# Altium footprint library ThroHoleCap.PcbLib: 81 footprints (part 3 of 6)
Each footprint in its own frame and in the unit in brackets; x right, y up, seen from the top. Pads: shape width x height; smd on the part's side, far side on the other; paste and mask are expansions set on the pad; w line width, h text height; cw(c..) or ccw(c..) is an arc to the next point about the centre after c.
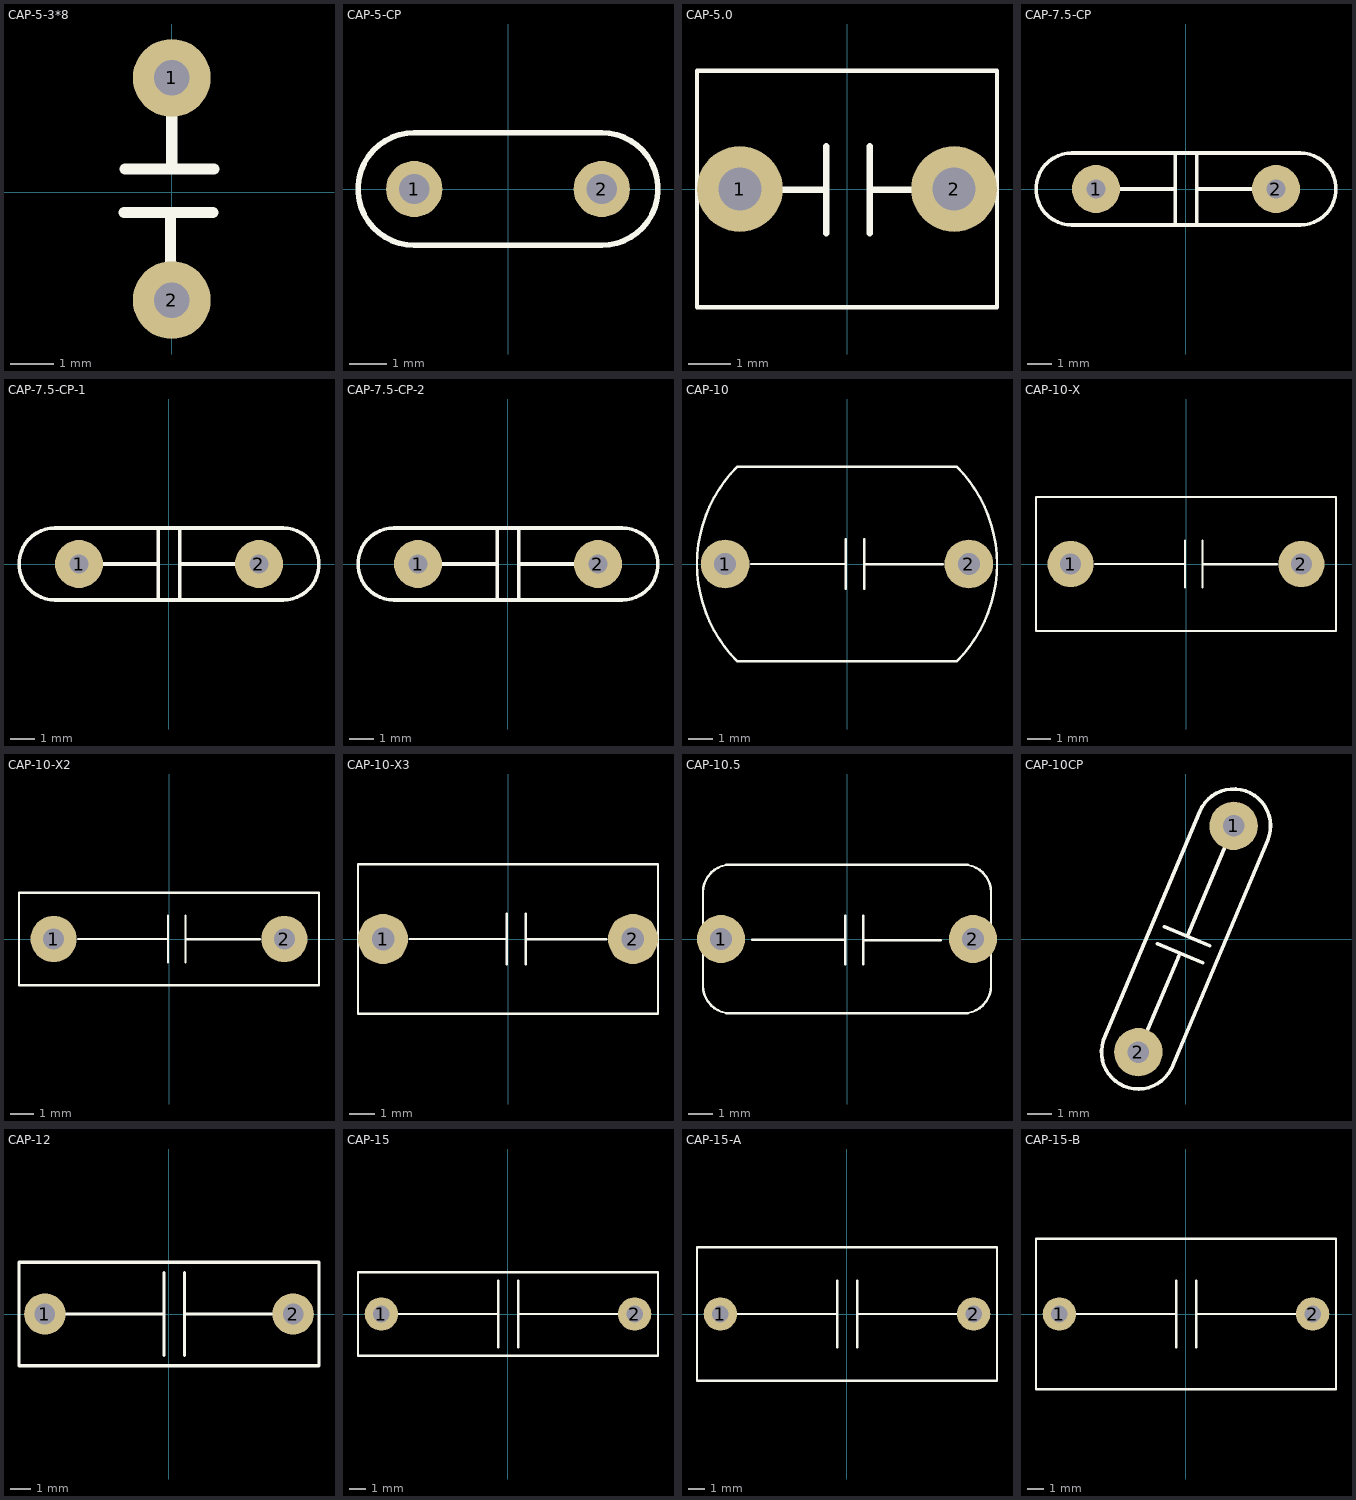
[diagram p2: the footprints below, top view; thin cyan lines are the x and y axes]

## CAP-5-3*8 [mil]
pads (2):
  round 70 hole 32: 1(0,103) 2(0,-97)
Top Overlay:
  lines w10: -43,-18 37,-18 ; -42,21 38,21 ; -1,-96 -1,-18 ; 0,21 0,103
3D body "User Library-Capacitor no pol 0_2in pitch.STEP": height 285, standoff -93.74, extent -60,-104 65,116

## CAP-5-CP [mm]
pads (2):
  round 1.5 hole 0.8: 1(-2.5,0) 2(2.5,0)
Top Overlay:
  lines w0.15: -2.5,-1.5 cw(c-2.5,0) -2.5,1.5 2.5,1.5 cw(c2.5,0) 2.5,-1.5 -2.5,-1.5
3D body "User Library-Kondensator_5mm.step": height 10.5, standoff -2.07, extent -4,-1.255 4,1.255

## CAP-5.0 [mm]
pads (2):
  round 2 hole 1: 1(-2.5,0) 2(2.5,0)
Top Overlay:
  lines w0.1: 3.5,-2.76 -3.5,-2.76 -3.5,2.76 3.5,2.76 ; 3.5,-2.75 3.5,2.75
  lines w0.15: -1.5,-0.021 -0.484,-0.021 ; -0.484,-1.037 -0.484,0.995 ; 0.532,-1.037 0.532,0.995 ; 0.532,-0.021 1.548,-0.021
3D body "User Library-CAPACITOR_5mm.step": height 11, standoff -4, extent -3.5,-2.76 3.5,2.76

## CAP-7.5-CP [mm]
pads (2):
  round 2 hole 0.8: 1(-3.75,0) 2(3.75,0)
Top Overlay:
  lines w0.15: -3.75,0 -0.45,0 ; -0.45,-1.5 -0.45,1.5 ; 0.45,-1.5 0.45,1.5 ; 0.45,0 3.75,0 ; -4.75,-1.5 cw(c-4.75,0) -4.75,1.5 4.75,1.5 cw(c4.75,0) 4.75,-1.5 -4.75,-1.5
3D body "User Library-final MOV7,5.step": height 16.5, standoff -2, extent -5.701,-1.415 5.718,1.413

## CAP-7.5-CP-1 [mm]
pads (2):
  round 2 hole 0.8: 1(-3.75,0) 2(3.75,0)
Top Overlay:
  lines w0.15: -3.75,0 -0.45,0 ; -0.45,-1.5 -0.45,1.5 ; 0.45,-1.5 0.45,1.5 ; 0.45,0 3.75,0 ; -4.75,-1.5 cw(c-4.75,0) -4.75,1.5 4.75,1.5 cw(c4.75,0) 4.75,-1.5 -4.75,-1.5
3D body "ECK-A3D102KBP.step": height 9.05, standoff -4.16, extent -4,-1.19 4.001,1.192

## CAP-7.5-CP-2 [mm]
pads (2):
  round 2 hole 0.8: 1(-3.75,0) 2(3.75,0)
Top Overlay:
  lines w0.15: -3.75,0 -0.45,0 ; -0.45,-1.5 -0.45,1.5 ; 0.45,-1.5 0.45,1.5 ; 0.45,0 3.75,0 ; -4.75,-1.5 cw(c-4.75,0) -4.75,1.5 4.75,1.5 cw(c4.75,0) 4.75,-1.5 -4.75,-1.5
3D body "User Library-DEBB33A472KA3B.STEP": height 16, standoff -4, extent -6,-1.99 6,1.99

## CAP-10 [mm]
pads (2):
  round 2 hole 0.9: 1(-5,0) 2(5,0)
Top Overlay:
  lines w0.1: -3.928,0 -0.047,0.003 ; -0.047,-1.016 -0.047,1.016 ; 0.715,-1.016 0.715,1.016 ; 0.715,-0.007 3.939,-0.007 ; -4.5,-4 cw(c-0.5,0) -4.5,4 4.5,4 cw(c0.5,0) 4.5,-4 -4.5,-4
3D body "User Library-RAD CAP 12_5MM.STEP": height 15.97, standoff -4.44, extent -6.25,-2.95 6.25,2.95

## CAP-10-X [mm]
pads (2):
  round 2 hole 0.9: 1(-5,0) 2(5,0)
Top Overlay:
  lines w0.1: -3.928,0 -0.047,0.003 ; -0.047,-1.016 -0.047,1.016 ; 0.715,-1.016 0.715,1.016 ; 0.715,-0.007 3.939,-0.007 ; -6.5,-2.9 6.5,-2.9 6.5,2.9 -6.5,2.9 -6.5,-2.9
3D body "User Library-B81122-C1472-M.step": height 12, standoff -1.5, extent -6.5,-3 6.5,3

## CAP-10-X2 [mm]
pads (2):
  round 2 hole 0.9: 1(-5,0) 2(5,0)
Top Overlay:
  lines w0.1: -3.928,0 -0.047,0.003 ; -0.047,-1.016 -0.047,1.016 ; 0.715,-1.016 0.715,1.016 ; 0.715,-0.007 3.939,-0.007 ; -6.5,-2 6.5,-2 6.5,2 -6.5,2 -6.5,-2
3D body "User Library-MKS4(H9).step": height 9, standoff -1.5, extent -6.5,-2 6.5,2

## CAP-10-X3 [mm]
pads (2):
  round 2 hole 0.9: 1(-5,0) 2(5,0)
Top Overlay:
  lines w0.1: -3.928,0 -0.047,0.003 ; -0.047,-1.016 -0.047,1.016 ; 0.715,-1.016 0.715,1.016 ; 0.715,-0.007 3.939,-0.007 ; -6,-3 -6,3 6,3 6,-3 -6,-3
3D body "User Library-K73-17(12_6_10).step": height 11.5, standoff -1.5, extent -6,-3 6,3

## CAP-10.5 [mm]
pads (2):
  round 2 hole 0.9: 1(-5.25,0) 2(5.25,0)
Top Overlay:
  lines w0.1: -4.847,-3.1 cw(c-4.847,-1.947) -6,-1.947 -6,1.947 cw(c-4.847,1.947) -4.847,3.1 4.847,3.1 cw(c4.847,1.947) 6,1.947 6,-1.947 cw(c4.847,-1.947) 4.847,-3.1 -4.827,-3.1 ; -3.959,-0.037 -0.078,-0.034 ; -0.078,-1.053 -0.078,0.979 ; 0.684,-1.053 0.684,0.979 ; 0.684,-0.044 3.908,-0.044
3D body "电?": height 14.65, standoff -3.65, extent -6,-3.1 6,3.1

## CAP-10CP [mm]
pads (2):
  round 2 hole 0.9: 1(1.971,4.682) 2(-1.971,-4.682)
Top Overlay:
  lines w0.15: -3.423,-4.203 0.566,5.273 cw(c1.971,4.682) 3.376,4.091 -0.613,-5.385 ; -3.42,-4.209 ccw(c-1.971,-4.682) -0.62,-5.388 ; -1.577,-3.746 -0.345,-0.819 -0.296,-0.702 ; -1.183,-0.191 0.69,-0.979 ; -0.887,0.511 0.986,-0.277 ; 0.049,0.117 0.148,0.351 1.577,3.746
3D body "User Library-440LD68.STEP": height 23.5, standoff -3, extent -3.024,-9.206 2.976,9.094

## CAP-12 [mm]
pads (2):
  round 2 hole 1: 1(-6,0) 2(6,0)
Top Overlay:
  lines w0.15: -6.25,0 -0.25,0 ; -0.25,-2 -0.25,2 ; 0.75,-2 0.75,2 ; 0.75,0 6.75,0 ; -7.25,-2.5 -7.25,2.5 7.25,2.5 7.25,-2.5 -7.25,-2.5
3D body "User Library-SV07AC104KAA.step": height 12.7, standoff -31.75, extent -7.239,-2.54 7.239,2.54

## CAP-15 [mm]
pads (2):
  round 2 hole 1: 1(-7.6,0) 2(7.6,0)
Top Overlay:
  lines w0.15: -7.6,0 -0.6,0 ; -0.6,-2 -0.6,2 ; 0.6,-2 0.6,2 ; 0.6,0 7.6,0 ; -9,-2.5 9,-2.5 9,2.5 -9,2.5 -9,-2.5
3D body "User Library-MKP10(P15)(B5)(H11).step": height 11, standoff -1.5, extent -9,-2.5 9,2.5

## CAP-15-A [mm]
pads (2):
  round 2 hole 1: 1(-7.6,0) 2(7.6,0)
Top Overlay:
  lines w0.15: -7.6,0 -0.6,0 ; -0.6,-2 -0.6,2 ; 0.6,-2 0.6,2 ; 0.6,0 7.6,0 ; -9,-4 9,-4 9,4 -9,4 -9,-4
3D body "User Library-K73-17(18_8_15).step": height 16.5, standoff -1.5, extent -9,-4 9,4
3D body "User Library-WIMA Capacitor.step": height 15, standoff -2.5, extent -9,-4 9,4

## CAP-15-B [mm]
pads (2):
  round 2 hole 1: 1(-7.6,0) 2(7.6,0)
Top Overlay:
  lines w0.15: -7.6,0 -0.6,0 ; -0.6,-2 -0.6,2 ; 0.6,-2 0.6,2 ; 0.6,0 7.6,0 ; -9,-4.5 -9,4.5 9,4.5 9,-4.5 -9,-4.5
3D body "User Library-K73-17(18_8_15).STEP": height 15, standoff -2.5, extent -9,-4.5 9,4.5